# Altium footprint library дроссели и трансы.PcbLib: 41 footprints (part 2 of 3)
Each footprint in its own frame and in the unit in brackets; x right, y up, seen from the top. Pads: shape width x height; smd on the part's side, far side on the other; paste and mask are expansions set on the pad; w line width, h text height; cw(c..) or ccw(c..) is an arc to the next point about the centre after c.
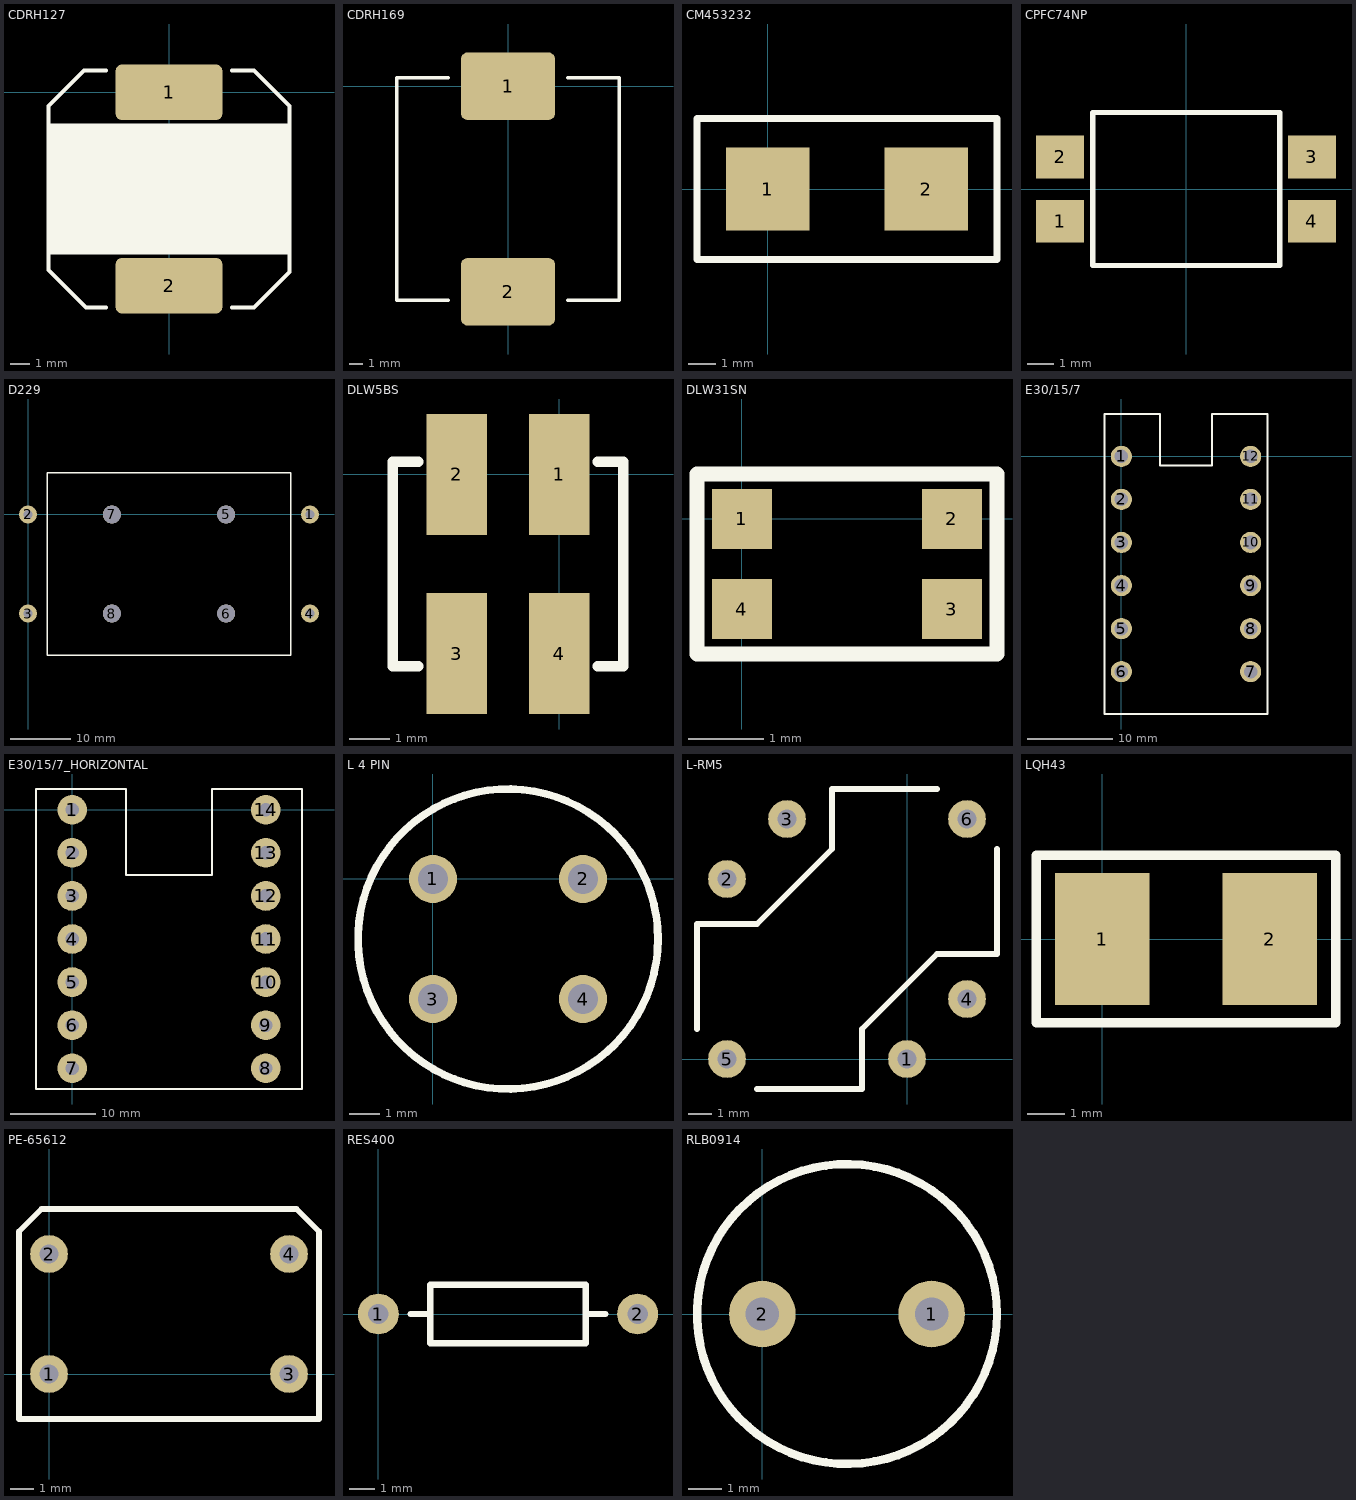
[diagram p1: the footprints below, top view; thin cyan lines are the x and y axes]

## CDRH127 [mm]
pads (2):
  rrect20% 5.4x2.8 smd mask+0.025: 1(0,0) 2(0,-9.8)
Top Overlay:
  region: -6,-8.2 6,-8.2 6,-1.6 -6,-1.6
  lines w0.2: -3.2,-10.9 -4.2,-10.9 -6.1,-9 -6.1,-0.7 -4.3,1.1 -3.2,1.1 ; 3.2,-10.9 4.3,-10.9 6.1,-9.1 6.1,-0.7 4.3,1.1 3.2,1.1
3D body "SUMIDA-CDRH127_LD.SLDPRT": height 7.5, standoff 0.05, extent -6,-11.071 6,1.271

## CDRH169 [mm]
pads (2):
  rrect20% 7x5 smd: 1(0,0) 2(0,-15.24)
Top Overlay:
  lines w0.254: -4.445,-15.875 -8.255,-15.875 -8.255,0.635 -4.445,0.635 ; 4.445,-15.875 8.255,-15.875 8.255,0.635 4.445,0.635

## CM453232 [mm]
pads (2):
  rect 3x3 smd: 1(0,0) 2(5.715,0)
Top Overlay:
  lines w0.254: -2.54,-2.54 8.255,-2.54 8.255,2.54 -2.54,2.54 -2.54,-2.54

## CPFC74NP [mm]
pads (4):
  rect 1.8x1.6 smd: 1(-4.7,-1.2) 2(-4.7,1.2) 3(4.7,1.2) 4(4.7,-1.2)
Top Overlay:
  lines w0.2: -3.48,-2.855 3.505,-2.855 3.505,2.86 -3.48,2.86 -3.48,-2.855
3D body "User Library-CPFC74.SLDPRT": height 5.07, standoff 0, extent -4.754,-2.75 4.754,2.75

## D229 [mm]
pads (8):
  round 3 hole 1.5: 1(46.99,0) 2(0,0) 3(0,-16.51) 4(46.99,-16.51)
  round 3 hole 3: 5(33.02,0) 6(33.02,-16.51) 7(13.97,0) 8(13.97,-16.51)
Top Overlay:
  lines w0.254: 3.175,-23.495 43.815,-23.495 43.815,6.985 3.175,6.985 3.175,-23.495

## DLW5BS [mm]
pads (4):
  rect 1.5x3 smd: 1(0,0) 2(-2.54,0) 3(-2.54,-4.445) 4(0,-4.445)
Top Overlay:
  lines w0.254: -3.492,-4.763 -4.127,-4.763 -4.127,0.318 -3.492,0.318 ; 0.953,-4.763 1.587,-4.763 1.587,0.318 0.953,0.318

## DLW31SN [mm]
pads (4):
  rect 0.8x0.8 smd: 1(0,0) 2(2.8,0) 3(2.8,-1.2) 4(0,-1.2)
Top Overlay:
  lines w0.2: -0.6,-1.8 -0.6,0.6 3.4,0.6 3.4,-1.8 -0.6,-1.8

## E30/15/7 [mm]
pads (12):
  round 2.5 hole 1.6: 1(0,0) 2(0,-5.08) 3(0,-10.16) 4(0,-15.24) 5(0,-20.32) 6(0,-25.4) 7(15.24,-25.4) 8(15.24,-20.32) 9(15.24,-15.24) 10(15.24,-10.16) 11(15.24,-5.08) 12(15.24,0)
Top Overlay:
  lines w0.254: -1.98,-30.4 17.22,-30.4 17.22,5 10.668,5 10.668,-1.096 4.572,-1.096 4.572,5 -1.98,5 -1.98,-30.4

## E30/15/7_HORIZONTAL [mm]
pads (14):
  round 3.5 hole 1.6: 1(0,0) 2(0,-5.08) 3(0,-10.16) 4(0,-15.24) 5(0,-20.32) 6(0,-25.4) 7(0,-30.48) 8(22.86,-30.48) 9(22.86,-25.4) 10(22.86,-20.32) 11(22.86,-15.24) 12(22.86,-10.16) 13(22.86,-5.08) 14(22.86,0)
Top Overlay:
  lines w0.254: -4.27,-32.94 27.13,-32.94 27.13,2.46 16.51,2.46 16.51,-7.7 6.35,-7.7 6.35,2.46 -4.27,2.46 -4.27,-32.94

## L 4 PIN [mm]
pads (4):
  round 1.6 hole 1: 1(0,0) 2(5,0) 3(0,-4) 4(5,-4)
Top Overlay:
  circle w0.254: c2.5,-2 r5

## L-RM5 [mm]
pads (6):
  round 1.6 hole 0.8: 1(0,0) 2(-7.62,7.62) 3(-5.08,10.16) 4(2.54,2.54) 5(-7.62,0) 6(2.54,10.16)
Top Overlay:
  lines w0.254: -8.89,1.27 -8.89,5.715 -8.255,5.715 -6.35,5.715 -3.175,8.89 -3.175,10.795 -3.175,11.43 1.27,11.43 ; -6.35,-1.27 -1.905,-1.27 -1.905,-0.635 -1.905,1.27 1.27,4.445 3.175,4.445 3.81,4.445 3.81,8.89

## LQH43 [mm]
pads (2):
  rect 2.5x3.5 smd: 1(0,0) 2(4.445,0)
Top Overlay:
  lines w0.254: -1.746,-2.222 -1.746,2.222 6.191,2.222 6.191,-2.222 -1.746,-2.222
3D body "User Library-L1812.SLDPRT": height 2.75, standoff 0, extent -0.2,-1.7 4.6,1.7

## PCBComponent_1 [mm]

## PE-65612 [mm]
pads (4):
  round 1.6 hole 0.8: 1(0,0) 2(0,5.08) 3(10.16,0) 4(10.16,5.08)
Top Overlay:
  lines w0.254: -1.27,-1.905 11.43,-1.905 11.43,6.032 10.477,6.985 -0.318,6.985 -1.27,6.032 -1.27,-1.905

## RES400 [mm]
pads (2):
  round 1.6 hole 0.8: 1(0,0) 2(10.16,0)
Top Overlay:
  lines w0.254: 1.27,0 2.032,0 ; 8.128,0 8.89,0 ; 2.032,-1.143 2.032,1.143 8.128,1.143 8.128,-1.143 2.032,-1.143

## RLB0914 [mm]
pads (2):
  round 2 hole 1: 1(5.08,0) 2(0,0)
Top Overlay:
  circle w0.254: c2.54,0 r4.5
3D body "User Library-RLB 0914.SLDPRT": height 12, standoff -25, extent -1.81,-4.35 6.89,4.35